# Altium footprint library TrackCommanderCar_ControlPart.PcbLib: 56 footprints (part 2 of 4)
Each footprint in its own frame and in the unit in brackets; x right, y up, seen from the top. Pads: shape width x height; smd on the part's side, far side on the other; paste and mask are expansions set on the pad; w line width, h text height; cw(c..) or ccw(c..) is an arc to the next point about the centre after c.
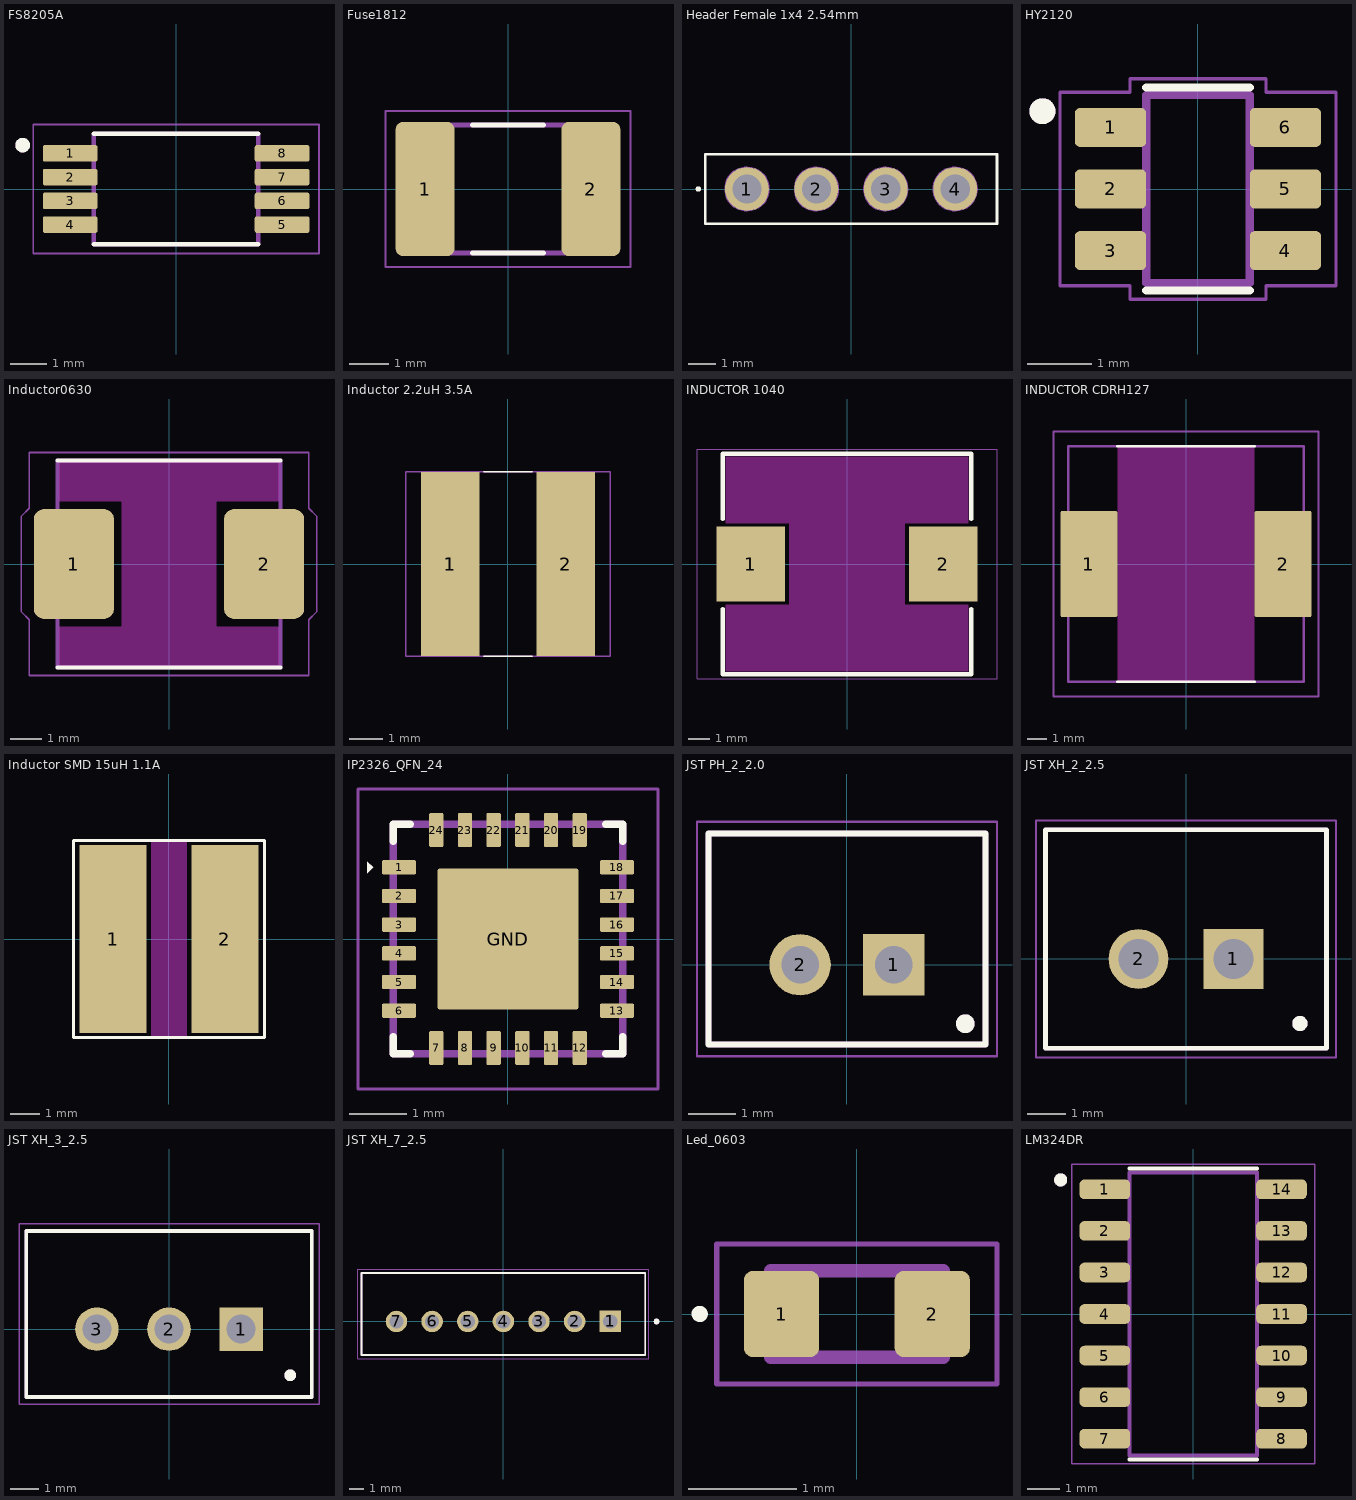
[diagram p1: the footprints below, top view; thin cyan lines are the x and y axes]

## FS8205A [mm]
pads (8):
  rrect25% 1.5x0.45 smd mask+0.05: 1(-2.9,0.975) 2(-2.9,0.325) 3(-2.9,-0.325) 4(-2.9,-0.975) 5(2.9,-0.975) 6(2.9,-0.325) 7(2.9,0.325) 8(2.9,0.975)
Top Overlay:
  circle w0.2: c-4.2,1.2 r0.1
  lines w0.127: -2.25,-1.515 2.25,-1.515 ; -2.25,1.515 2.25,1.515
Top Assembly (Mech13):
  circle w0.2: c-4.2,1.2 r0.1
  lines w0.127: -2.25,-1.515 -2.25,1.515 2.25,1.515 2.25,-1.515 -2.25,-1.515
Mechanical 15:
  lines w0.05: -3.91,-1.765 -3.91,1.765 3.91,1.765 3.91,-1.765 -3.91,-1.765
3D body "step_temp.STEP": height 1.2, standoff 0, extent -3.2,-1.465 3.2,1.465

## Fuse1812 [mm]
pads (2):
  rrect25% 1.5x3.4 smd mask+0.07: 1(-2.1,0) 2(2.1,0)
Top Overlay:
  lines w0.127: -0.9,-1.62 0.9,-1.62 ; -0.9,1.62 0.9,1.62
Top Assembly (Mech13):
  lines w0.127: -2.275,-1.62 2.275,-1.62 2.275,1.62 -2.275,1.62 -2.275,-1.62
Mechanical 15:
  lines w0.05: -3.1,-1.977 -3.1,1.977 3.1,1.977 3.1,-1.977 -3.1,-1.977
3D body "step_temp.STEP": height 0.85, standoff 0, extent -2.275,-1.62 2.275,1.62

## Header Female 1x4 2.54mm [mm]
pads (4):
  round 1.605 hole 1.07: 1(-3.81,0) 2(-1.27,0) 3(1.27,0) 4(3.81,0)
Top Overlay:
  circle w0.1: c-5.588,0 r0.05
  lines w0.1: -5.338,-1.27 5.338,-1.27 5.338,1.27 -5.338,1.27 -5.338,-1.27
Top 3D Body:
  circle w0.05: c3.81,0 r0.803
  circle w0.05: c1.27,0 r0.803
  circle w0.05: c-1.27,0 r0.803
  circle w0.05: c-3.81,0 r0.803
  circle w0.05: c-3.81,0 r0.803
Mechanical 15:
  circle w0.025: c3.81,0 r0.803
  circle w0.025: c1.27,0 r0.803
  circle w0.025: c-1.27,0 r0.803
  circle w0.025: c-3.81,0 r0.803
  lines w0.05: -5.338,-1.27 5.338,-1.27 5.338,1.27 -5.338,1.27 -5.338,-1.27
3D body "PPPC041LFBNRC--3DModel-STEP-269445.STEP": height 8.51, standoff -3.2, extent -5.33,-1.27 5.338,1.27

## HY2120 [mm]
pads (6):
  rrect25% 1.1x0.6 smd mask+0.07: 1(-1.35,0.95) 2(-1.35,0) 3(-1.35,-0.95) 4(1.35,-0.95) 5(1.35,0) 6(1.35,0.95)
Top Overlay:
  circle w0.2: c-2.4,1.2 r0.1
  lines w0.127: -0.8,-1.565 0.8,-1.565 ; -0.8,1.565 0.8,1.565
Top Assembly (Mech13):
  circle w0.2: c-2.4,1.2 r0.1
  lines w0.127: -0.8,-1.45 0.8,-1.45 0.8,1.45 -0.8,1.45 -0.8,-1.45
Mechanical 15:
  lines w0.05: -2.13,-1.495 -1.05,-1.495 -1.05,-1.7 1.05,-1.7 1.05,-1.495 2.13,-1.495 2.13,1.495 1.05,1.495 1.05,1.7 -1.05,1.7 -1.05,1.495 -2.13,1.495 -2.13,-1.495
3D body "User Library-SOT-23-6-THIN.step": height 1.1, standoff 0, extent -1.5,-1.5 1.5,1.5

## Inductor0630 [mm]
pads (2):
  rrect25% 2.553x3.5 smd mask+0.07: 1(-3.025,0) 2(3.025,0)
Top Overlay:
  lines w0.127: -3.55,-3.3 3.55,-3.3 ; -3.55,3.3 3.55,3.3
Keep-Out Layer:
  region: -3.5,3.3 3.5,3.3 3.5,2 1.5,2 1.5,-2 3.5,-2 3.5,-3.3 -3.5,-3.3 -3.5,-2 -1.5,-2 -1.5,2 -3.5,2
Top Assembly (Mech13):
  lines w0.127: -3.55,-3.3 3.55,-3.3 3.55,3.3 -3.55,3.3 -3.55,-3.3
Mechanical 15:
  lines w0.05: -4.699,-1.526 -4.45,-1.775 -4.45,-3.55 4.45,-3.55 4.45,-1.775 4.699,-1.526 4.699,1.526 4.45,1.775 4.45,3.55 -4.45,3.55 -4.45,1.775 -4.699,1.526 -4.699,-1.526
3D body "step_temp.STEP": height 3, standoff 0, extent -3.6,-3.325 3.6,3.325

## Inductor 2.2uH 3.5A [mm]
pads (3):
  rect 1.75x5.5 smd mask+0.1: 1(-1.725,0) 1(-1.725,0) 2(1.725,0)
Top Overlay:
  lines w0.05: -0.725,-2.75 0.725,-2.75 ; -0.725,2.75 0.725,2.75
Mechanical 15:
  lines w0.05: -3.05,-2.75 -3.05,2.75 3.05,2.75 3.05,-2.75 -3.05,-2.75
3D body "744774022.stp": height 4.5, standoff 0, extent -2.889,-2.6 2.899,2.6

## INDUCTOR 1040 [mm]
pads (2):
  rect 3.2x3.5 smd mask+0.09: 1(-4.5,0) 2(4.5,0)
Top Layer keep-out:
  region: -5.653,1.9 -5.653,5 5.65,5 5.65,1.9 2.7,1.9 2.7,-1.9 5.65,-1.9 5.65,-5 -5.653,-5 -5.653,-1.9 -2.7,-1.9 -2.7,1.9
Top Overlay:
  lines w0.2: -5.8,-2.1 -5.8,-5.15 5.8,-5.15 5.8,-2.1 ; -5.8,2.1 -5.8,5.15 5.8,5.15 5.8,2.1
Top Courtyard:
  lines w0.05: -7,-5.35 -7,5.35 7,5.35 7,-5.35 -7,-5.35
3D body "INDUCTOR1040.step": height 4.2, standoff 0, extent -5.65,-5 5.65,5

## INDUCTOR CDRH127 [mm]
pads (2):
  rrect5% 2.9x5.4 smd mask+0.07: 1(-4.95,0) 2(4.95,0)
Top Overlay:
  lines w0.127: -3.5,-6 3.5,-6 ; -3.5,6 3.5,6
Keep-Out Layer:
  rectangle: -3.5,-6 3.5,6
Mechanical 1:
  lines w0.127: -6,-6 6,-6 6,6 -6,6 -6,-6
Mechanical 15:
  lines w0.1: -6.75,-6.75 6.75,-6.75 6.75,6.75 -6.75,6.75 -6.75,-6.75
3D body "INDUCTOR_CDRH127_LDNP-220MC.STEP": height 8, standoff 0, extent -6,-6 6,6

## Inductor SMD 15uH 1.1A [mm] "SMD Power Inductor 15uH 1.1A, Size 5.7x5.7x3.2 mm"
pads (2):
  rect 2.25x6.3 smd mask+0.1: 1(-1.875,0) 2(1.875,0)
Top Overlay:
  lines w0.1: -3.2,-3.3 3.2,-3.3 3.2,3.3 -3.2,3.3 -3.2,-3.3
Keep-Out Layer:
  region: -0.6,3.3 0.6,3.3 0.6,-3.3 -0.6,-3.3
Mechanical 15:
  lines w0.05: -3.2,-3.3 3.2,-3.3 3.2,3.3 -3.2,3.3 -3.2,-3.3
  text ".Designator" at -1.3,3.2 h0.6
3D body "CDRH5D28NP-150NC.stp": height 2.77, standoff -0.02, extent -3.024,-3.024 3.024,3.024

## IP2326_QFN_24 [mm]
pads (25):
  rrect25% 0.6x0.25 smd mask+0.07: 1(-1.9,1.25) 2(-1.9,0.75) 3(-1.9,0.25) 4(-1.9,-0.25) 5(-1.9,-0.75) 6(-1.9,-1.25) 13(1.9,-1.25) 14(1.9,-0.75) 15(1.9,-0.25) 16(1.9,0.25) 17(1.9,0.75) 18(1.9,1.25)
  rrect25% 0.25x0.6 smd mask+0.07: 7(-1.25,-1.9) 8(-0.75,-1.9) 9(-0.25,-1.9) 10(0.25,-1.9) 11(0.75,-1.9) 12(1.25,-1.9) 19(1.25,1.9) 20(0.75,1.9) 21(0.25,1.9) 22(-0.25,1.9) 23(-0.75,1.9) 24(-1.25,1.9)
  rrect2% 2.45x2.45 smd paste-0.45 mask+0.07: GND(0,0)
Top Overlay:
  region: -2.45,1.35 -2.35,1.25 -2.45,1.15
  lines w0.127: -2,-1.705 -2,-2 -1.705,-2 ; -2,1.705 -2,2 -1.705,2 ; 1.705,-2 2,-2 2,-1.705 ; 1.705,2 2,2 2,1.705
Top Assembly (Mech13):
  lines w0.127: -2,-2 2,-2 2,2 -2,2 -2,-2
Mechanical 15:
  lines w0.05: -2.615,-2.615 2.615,-2.615 2.615,2.615 -2.615,2.615 -2.615,-2.615
3D body "step_temp.STEP": height 1, standoff 0, extent -2,-2 2,2

## JST PH_2_2.0 [mm]
pads (2):
  rect 1.308x1.308 / inner round 1.308 / far side rect 1.308x1.308 hole 0.8 mask+0.07: 1(1,0)
  round 1.308 hole 0.8 mask+0.07: 2(-1,0)
Top Overlay:
  circle w0.2: c2.524,-1.257 r0.1
  lines w0.127: -2.95,-1.7 2.95,-1.7 2.95,2.8 -2.95,2.8 -2.95,-1.7
Top Assembly (Mech13):
  circle w0.2: c2.524,-1.257 r0.1
  lines w0.127: -2.95,-1.7 -2.95,2.8 2.95,2.8 2.95,-1.7 -2.95,-1.7
Mechanical 15:
  lines w0.05: -3.2,-1.95 -3.2,3.05 3.2,3.05 3.2,-1.95 -3.2,-1.95
3D body "step_temp.STEP": height 6, standoff -3.4, extent -2.95,-1.7 2.95,2.8

## JST XH_2_2.5 [mm]
pads (2):
  rect 1.575x1.575 / inner round 1.575 / far side rect 1.575x1.575 hole 1.05 mask+0.07: 1(1.25,0)
  round 1.575 hole 1.05 mask+0.07: 2(-1.25,0)
Top Overlay:
  circle w0.2: c3,-1.7 r0.1
  lines w0.127: -3.7,-2.35 -3.7,3.4 3.7,3.4 3.7,-2.35 -3.7,-2.35
Top Assembly (Mech13):
  circle w0.2: c3,-1.7 r0.1
  lines w0.127: -3.7,-2.35 -3.7,3.4 3.7,3.4 3.7,-2.35 -3.7,-2.35
Mechanical 15:
  lines w0.05: -3.95,-2.6 3.95,-2.6 3.95,3.65 -3.95,3.65 -3.95,-2.6
3D body "step_temp.STEP": height 7, standoff -3.4, extent -3.7,-2.35 3.7,3.4

## JST XH_3_2.5 [mm]
pads (3):
  rect 1.508x1.508 / inner round 1.508 / far side rect 1.508x1.508 hole 1 mask+0.07: 1(2.5,0)
  round 1.508 hole 1 mask+0.07: 2(0,0) 3(-2.5,0)
Top Overlay:
  circle w0.2: c4.2,-1.6 r0.1
  lines w0.127: -4.95,-2.35 4.95,-2.35 4.95,3.4 -4.95,3.4 -4.95,-2.35
Top Assembly (Mech13):
  circle w0.2: c4.2,-1.6 r0.1
  lines w0.127: -4.95,-2.35 4.95,-2.35 4.95,3.4 -4.95,3.4 -4.95,-2.35
Mechanical 15:
  lines w0.05: -5.2,-2.6 5.2,-2.6 5.2,3.65 -5.2,3.65 -5.2,-2.6
3D body "step_temp.STEP": height 7, standoff -3.4, extent -4.95,-2.35 4.95,3.4

## JST XH_7_2.5 [mm]
pads (7):
  rect 1.508x1.508 / inner round 1.508 / far side rect 1.508x1.508 hole 1 mask+0.07: 1(7.5,0)
  round 1.508 hole 1 mask+0.07: 2(5,0) 3(2.5,0) 4(0,0) 5(-2.5,0) 6(-5,0) 7(-7.5,0)
Top Overlay:
  circle w0.2: c10.75,0 r0.1
  lines w0.127: -9.95,-2.35 9.95,-2.35 9.95,3.4 -9.95,3.4 -9.95,-2.35
Top Assembly (Mech13):
  circle w0.2: c10.75,0 r0.1
  lines w0.127: -9.95,-2.35 9.95,-2.35 9.95,3.4 -9.95,3.4 -9.95,-2.35
Mechanical 15:
  lines w0.05: -10.2,-2.6 10.2,-2.6 10.2,3.65 -10.2,3.65 -10.2,-2.6
3D body "step_temp.STEP": height 7, standoff -3.4, extent -9.95,-2.35 9.95,3.4

## Led_0603 [mm]
pads (2):
  rrect25% 0.7x0.8 smd mask+0.07: 1(-0.7,0) 2(0.7,0)
Top Overlay:
  circle w0.1: c-1.459,0 r0.025
Top Assembly (Mech13):
  lines w0.127: -0.8,-0.4 -0.8,0.4 0.8,0.4 0.8,-0.4 -0.8,-0.4
Mechanical 15:
  lines w0.05: -1.3,-0.65 1.3,-0.65 1.3,0.65 -1.3,0.65 -1.3,-0.65
3D body "step_temp.STEP": height 0.55, standoff 0, extent -0.8,-0.4 0.8,0.4

## LM324DR [mm]
pads (14):
  rrect50% 1.55x0.6 smd mask+0.05: 1(-2.7,3.81) 2(-2.7,2.54) 3(-2.7,1.27) 4(-2.7,0) 5(-2.7,-1.27) 6(-2.7,-2.54) 7(-2.7,-3.81) 8(2.7,-3.81) 9(2.7,-2.54) 10(2.7,-1.27) 11(2.7,0) 12(2.7,1.27) 13(2.7,2.54) 14(2.7,3.81)
Top Overlay:
  circle w0.2: c-4.05,4.1 r0.1
  lines w0.127: -1.95,-4.452 1.95,-4.452 ; -1.95,4.452 1.95,4.452
Top Assembly (Mech13):
  circle w0.2: c-4.05,4.1 r0.1
  lines w0.127: -1.95,-4.325 -1.95,4.325 1.95,4.325 1.95,-4.325 -1.95,-4.325
Mechanical 15:
  lines w0.05: -3.71,-4.575 -3.71,4.575 3.71,4.575 3.71,-4.575 -3.71,-4.575
3D body "step_temp.STEP": height 1.75, standoff 0, extent -3,-4.325 3,4.325